# Altium footprint library User.PcbLib: 317 footprints (part 19 of 20)
Each footprint in its own frame and in the unit in brackets; x right, y up, seen from the top. Pads: shape width x height; smd on the part's side, far side on the other; paste and mask are expansions set on the pad; w line width, h text height; cw(c..) or ccw(c..) is an arc to the next point about the centre after c.
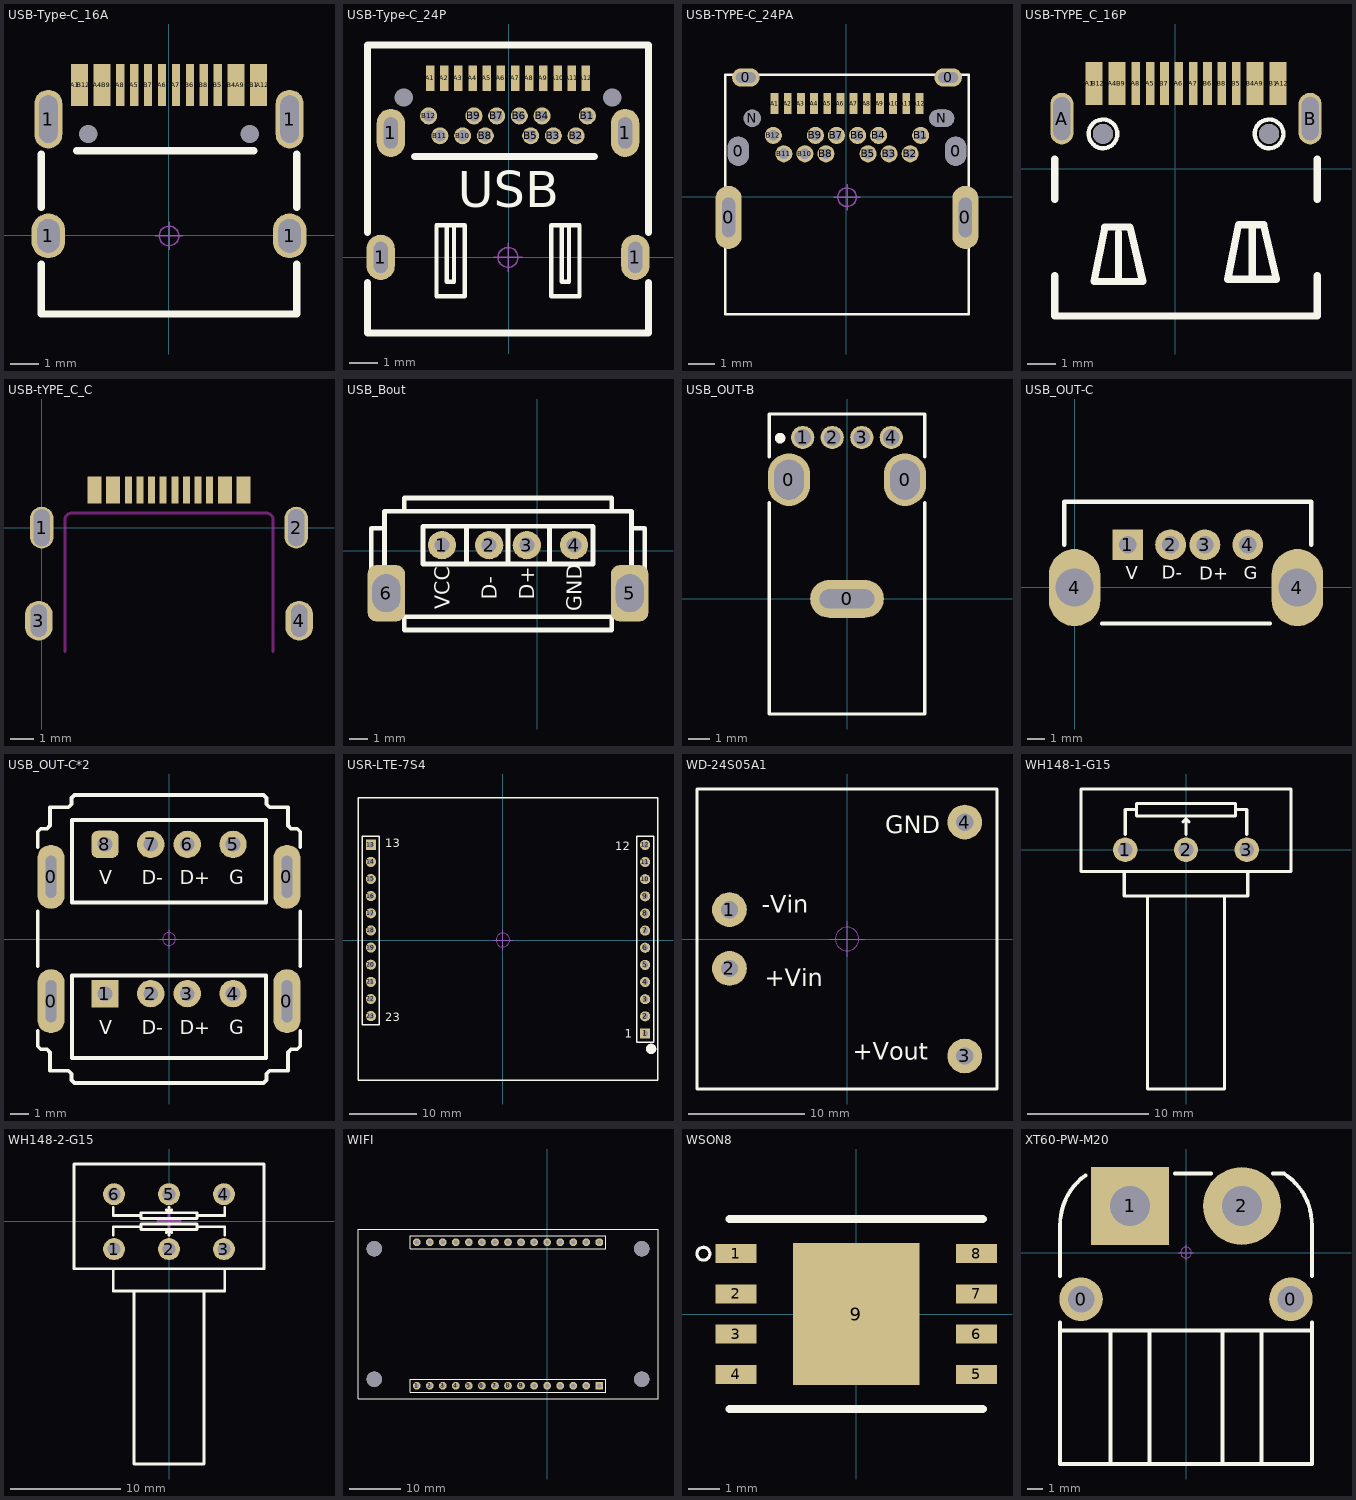
[diagram p18: the footprints below, top view; thin cyan lines are the x and y axes]

## USB-Type-C_16A [mm]
pads (22):
  round 0 hole 0.65: 0(-2.89,3.625) 0(2.89,3.625)
  oval 1.2x1.6 hole 0.8 slot 1.2 at 90 deg: 1(-4.32,-0.025) 1(4.32,-0.025)
  oval 1x2.1 hole 0.66 slot 1.7 at 90 deg: 1(-4.32,4.155) 1(4.32,4.155)
  rect 0.3x1.5 smd: A1(-3.35,5.375) A4(-2.55,5.375) A5(-1.25,5.375) A6(-0.25,5.375) A7(0.25,5.375) A8(-1.75,5.375) A9(2.55,5.375) A12(3.35,5.375) B1(3.05,5.375) B4(2.25,5.375) B5(1.75,5.375) B6(0.75,5.375) B7(-0.75,5.375) B8(1.25,5.375) B9(-2.25,5.375) B12(-3.05,5.375)
Top Overlay:
  lines w0.254: -4.572,-1.041 -4.572,-2.819 4.572,-2.819 4.572,-1.041 ; -4.572,0.991 -4.572,2.896 ; -3.302,3.023 3.048,3.023 ; 4.572,0.991 4.572,2.896
Mechanical 15:
  circle w0.05: c0,-0.025 r0.35
  lines w0.05: -0.5,-0.025 0.5,-0.025 ; 0,-0.525 0,0.475
3D body "USB Type-C_A.STEP": height 3.25, standoff -0.85, extent -4.47,-2.625 4.47,5.275

## USB-Type-C_24P [mm] "USB"
pads (30):
  round 0 hole 0.65: 0(-3.7,5.64) 0(3.65,5.64)
  oval 1x1.6 hole 0.5 slot 1.1 at 90 deg: 1(-4.515,0) 1(4.465,0)
  oval 1x1.7 hole 0.5 slot 1.1 at 90 deg: 1(-4.155,4.39) 1(4.105,4.39)
  rect 0.3x0.9 smd: A1(-2.775,6.315) A2(-2.275,6.315) A3(-1.775,6.315) A4(-1.275,6.315) A5(-0.775,6.315) A6(-0.275,6.315) A7(0.225,6.315) A8(0.725,6.315) A9(1.225,6.315) A10(1.725,6.315) A11(2.225,6.315) A12(2.725,6.315)
  round 0.6 hole 0.4: B1(2.775,4.99) B2(2.375,4.29) B3(1.575,4.29) B4(1.175,4.99) B5(0.775,4.29) B6(0.375,4.99) B7(-0.425,4.99) B8(-0.825,4.29) B9(-1.225,4.99) B10(-1.625,4.29) B11(-2.425,4.29) B12(-2.825,4.99)
Top Overlay:
  lines w0.152: -2.184,1.13 -2.184,-0.855 -1.981,-0.855 -1.93,-0.855 -1.93,1.13 ; 1.873,1.13 1.873,-0.855 2.127,-0.855 2.127,1.13 ; -2.545,-1.37 -1.545,-1.37 -1.545,1.13 -2.545,1.13 -2.545,-1.37 ; 1.499,-1.37 1.499,1.13 2.499,1.13 2.499,-1.37 1.499,-1.37
  lines w0.254: -4.978,-0.889 -4.978,-2.667 4.928,-2.667 4.928,-0.889 ; -4.978,0.889 -4.978,7.493 4.928,7.493 4.928,0.889 ; -3.327,3.556 3.023,3.556
  text "USB" at -1.803,1.778 h1.27
Mechanical 15:
  circle w0.05: c-0.025,0 r0.35
  lines w0.05: -0.525,0 0.475,0 ; -0.025,-0.5 -0.025,0.5
3D body "USB Type-C_24pin_A.STEP": height 3.31, standoff -1.33, extent -4.875,-2.53 4.825,7.37

## USB-TYPE-C_24PA [mm]
pads (32):
  oval 1x2.4 hole 0.5 slot 1.5 at 90 deg: 0(-4.475,-0.79) 0(4.525,-0.79)
  oval 0.8x1.1 hole 0.8 slot 1.1 at 90 deg: 0(-4.105,1.725) 0(4.155,1.725)
  oval 1.05x0.7 hole 0.4 slot 0.75 at 0 deg: 0(-3.82,4.525) 0(3.87,4.525)
  rect 0.3x0.8 smd: A1(-2.725,3.535) A2(-2.225,3.535) A3(-1.725,3.535) A4(-1.225,3.535) A5(-0.725,3.535) A6(-0.225,3.535) A7(0.275,3.535) A8(0.775,3.535) A9(1.275,3.535) A10(1.775,3.535) A11(2.275,3.535) A12(2.775,3.535)
  round 0.65 hole 0.4: B1(2.825,2.325) B2(2.425,1.625) B3(1.625,1.625) B4(1.225,2.325) B5(0.825,1.625) B6(0.425,2.325) B7(-0.375,2.325) B8(-0.775,1.625) B9(-1.175,2.325) B10(-1.575,1.625) B11(-2.375,1.625) B12(-2.775,2.325)
  round 0.65 hole 0.65: N(-3.575,2.975)
  oval 0.95x0.65 hole 0.65 slot 0.95 at 0 deg: N(3.625,2.975)
Top Overlay:
  lines w0.1: -4.6,-4.475 4.65,-4.475 4.65,4.625 -4.6,4.625 -4.6,-4.475
Mechanical 15:
  circle w0.05: c0.025,-0.025 r0.35
  lines w0.05: -0.475,-0.025 0.525,-0.025 ; 0.025,-0.525 0.025,0.475
3D body "type-Cĸ?": height 3.35, standoff -0.9, extent -4.6,-4.475 4.65,4.625

## USB-TYPE_C_16P [mm] "USB"
pads (20):
  oval 0.8x1.8 hole 0.6 slot 1.5 at 90 deg: A(-3.953,1.745) B(4.687,1.745)
  rect 0.3x1.5 smd: A1(-2.983,2.965) A4(-2.183,2.965) A5(-0.883,2.965) A6(0.117,2.965) A7(0.617,2.965) A8(-1.383,2.965) A9(2.917,2.965) A12(3.717,2.965) B1(3.417,2.965) B4(2.617,2.965) B5(2.117,2.965) B6(1.117,2.965) B7(-0.383,2.965) B8(1.617,2.965) B9(-1.883,2.965) B12(-2.683,2.965)
  round 0.7 hole 0.7 unplated: ""(-2.523,1.215) ""(3.257,1.215)
Top Overlay:
  circle w0.15: c3.257,1.215 r0.5
  circle w0.15: c-2.523,1.215 r0.5
  lines w0.254: -4.205,-3.726 -4.205,-5.123 4.939,-5.123 4.939,-3.726 ; -4.205,-1.059 -4.205,0.338 ; -1.981,-3.923 -1.981,-2.223 ; 2.669,-3.847 2.669,-1.947 ; 4.939,-1.059 4.939,0.338 ; -2.831,-3.923 -2.456,-2.023 -1.581,-2.023 -1.137,-3.923 -2.831,-3.923 ; 1.819,-3.847 3.513,-3.847 3.069,-1.947 2.194,-1.947 1.819,-3.847
3D body "USB Type-C_A.STEP": height 3.25, standoff -0.85, extent -4.113,-5.039 4.827,2.861

## USB-tYPE_C_C [mm]
pads (20):
  oval 1x1.8 hole 0.7 slot 1.6 at 90 deg: 1(0,0) 2(10.946,0)
  oval 1.2x1.7 hole 0.7 slot 1.4 at 90 deg: 3(-0.127,-4) 4(11.073,-4)
  rect 0.3x1.168 smd: A1(2.123,1.625) A4(2.923,1.625) A5(4.223,1.625) A6(5.223,1.625) A7(5.723,1.625) A8(3.723,1.625) A9(8.023,1.625) A12(8.823,1.625) B1(8.523,1.625) B4(7.723,1.625) B5(7.223,1.625) B6(6.223,1.625) B7(4.723,1.625) B8(6.723,1.625) B9(3.223,1.625) B12(2.423,1.625)
Keep-Out Layer:
  lines w0.127: 0.995,0.33 cw(c1.295,0.33) 1.295,0.63 ; 0.999,-5.334 0.999,0.333 ; 1.3,0.635 9.646,0.635 ; 9.651,0.63 cw(c9.651,0.33) 9.951,0.33 ; 9.948,-5.334 9.948,0.333
3D body "usbt_H0_48-L8_3.STEP": height 2.27, standoff -0.89, extent -0.275,-7.391 11.125,0.909

## USB_Bout [mm] "USB"
pads (6):
  round 1.5 hole 0.8: 1(-5.05,0.3) 2(-2.55,0.3) 3(-0.55,0.3) 4(1.95,0.3)
  rrect50% 2x3 hole 2 slot 1.5 at 0 deg: 5(4.9,-2.25) 6(-8,-2.25)
Top Overlay:
  lines w0.254: -8.1,-2.6 -8.8,-2.6 -8.8,1.2 -8.1,1.2 ; -7.05,-3.5 -7.05,-4.2 3.95,-4.2 3.95,-3.5 ; -7.05,2.1 -7.05,2.8 3.95,2.8 3.95,2.1 ; -3.75,-0.7 -3.75,1.3 ; -1.55,-0.7 -1.55,1.3 ; 0.65,-0.7 0.65,1.3 ; 5,-2.6 5.7,-2.6 5.7,1.2 5,1.2 ; -8.1,-3.5 5,-3.5 5,2.1 -8.1,2.1 -8.1,-3.5 ; -6.05,-0.7 -6.05,1.3 2.95,1.3 2.95,-0.7 -6.05,-0.7
  text "VCC" at -4.65,-3.1 h0.8
  text "D-" at -2.15,-2.6 h0.8
  text "D+" at -0.15,-2.6 h0.8
  text "GND" at 2.35,-3.2 h0.8
Bottom Overlay:
  lines w0.254: -3.75,-0.7 -3.75,1.3 ; -1.55,-0.7 -1.55,1.3 ; 0.65,-0.7 0.65,1.3 ; -8.15,-3.5 -8.15,2.1 5.05,2.1 5.05,-3.5 -8.15,-3.5 ; -6.05,-0.7 -6.05,1.3 2.95,1.3 2.95,-0.7 -6.05,-0.7
3D body "Samtec-USBR-A-S-S-O-TH.STEP": height 2.2, standoff -8.65, extent -9.352,-12.594 6.448,1.566

## USB_OUT-B [mm]
pads (7):
  oval 2x2.5 hole 1.4 slot 1.9 at 90 deg: 0(-2.75,5.65) 0(2.75,5.65)
  oval 3.5x1.8 hole 0.9 slot 2.6 at 0 deg: 0(0,0)
  round 1.1 hole 0.8: 1(-2.1,7.65) 2(-0.7,7.65) 3(0.7,7.65) 4(2.1,7.65)
Top Overlay:
  circle w0.25: c-3.173,7.62 r0.125
  lines w0.152: -3.683,4.572 -3.683,-5.461 3.683,-5.461 3.683,4.572 ; -3.683,6.731 -3.683,8.763 3.683,8.763 3.683,6.731
3D body "USB A型?": height 13.7, standoff -3.05, extent -3.56,-5.35 3.56,8.65

## USB_OUT-C [mm]
pads (6):
  rect 1.8x1.8 hole 1: 1(3.1,2.475)
  round 1.8 hole 1: 2(5.6,2.475) 3(7.6,2.475) 4(10.1,2.475)
  oval 3x4.5 hole 2.2: 4(0,-0.025) 4(13,-0.025)
Top Overlay:
  lines w0.254: -0.6,2.475 -0.6,4.975 13.8,4.975 13.8,2.475 ; 1.6,-2.125 11.4,-2.125
  text "V" at 2.988,0.468 h0.76
  text "G" at 9.871,0.468 h0.76
  text "D+" at 7.281,0.443 h0.76
  text "D-" at 5.096,0.493 h0.76
Mechanical 1:
  lines w0.254: 2.9,2.275 cw(c3.1,2.275) 3.1,2.475
3D body "USB-H.stp": height 14, standoff -4, extent -0.605,-2.124 13.795,4.976

## USB_OUT-C*2 [mm]
pads (12):
  oval 1.5x3.5 hole 0.6 slot 2.3 at 90 deg: 0(-6.45,-3.4) 0(-6.45,3.4) 0(6.45,-3.4) 0(6.45,3.4)
  rect 1.5x1.5 hole 0.8: 1(-3.5,-2.985)
  round 1.5 hole 0.8: 2(-1,-2.985) 3(1,-2.985) 4(3.5,-2.985) 5(3.5,5.17) 6(1,5.17) 7(-1,5.17)
  rrect50% 1.5x1.5 hole 0.8: 8(-3.5,5.17)
Top Overlay:
  lines w0.203: -7.176,-5.024 -7.176,-5.863 -7.007,-6.031 -6.67,-6.031 -6.501,-6.2 -6.5,-6.199 -6.5,-7.199 -5.5,-7.199 -5.331,-7.369 -5.331,-7.706 -5.162,-7.875 5.162,-7.875 5.331,-7.706 5.331,-7.369 5.5,-7.2 6.5,-7.199 6.5,-6.199 6.501,-6.2 6.67,-6.031 7.007,-6.031 7.176,-5.863 7.176,-5.024 ; -7.176,-1.476 -7.176,1.524 ; -7.176,5.024 -7.176,5.863 -7.007,6.031 -6.67,6.031 -6.501,6.2 -6.5,6.199 -6.5,7.199 -5.5,7.199 -5.331,7.369 -5.331,7.706 -5.162,7.875 5.163,7.875 5.331,7.706 5.331,7.369 5.5,7.2 6.5,7.199 6.5,6.199 6.501,6.2 6.67,6.031 7.007,6.031 7.176,5.863 7.176,5.024 ; 7.176,-1.476 7.176,1.524 ; -5.3,-6.5 5.3,-6.5 5.3,-2 -5.3,-2 -5.3,-6.5 ; -5.3,2 -5.3,6.5 5.3,6.5 5.3,2 -5.3,2
  text "V" at -3.812,-5.207 h0.76
  text "G" at 3.3,-5.2 h0.76
  text "D+" at 0.6,-5.2 h0.76
  text "D-" at -1.5,-5.2 h0.76
  text "D-" at -1.5,3 h0.76
  text "D+" at 0.6,3 h0.76
  text "G" at 3.3,3 h0.76
  text "V" at -3.812,2.993 h0.76
Mechanical 15:
  circle w0.05: c0,0 r0.35
  lines w0.05: -0.5,0 0.5,0 ; 0,-0.5 0,0.5
3D body "USB A型14-2-14_2-180.STEP": height 14.26, standoff -4.03, extent -7.927,-7.8 7.927,7.8

## USR-LTE-7S4 [mm] "全网通4G DTU透传模块"
pads (23):
  rect 1.5x1.5 hole 0.85: 1(21.082,-13.843) 13(-19.558,14.122)
  round 1.5 hole 0.85: 2(21.082,-11.303) 3(21.082,-8.763) 4(21.082,-6.223) 5(21.082,-3.683) 6(21.082,-1.143) 7(21.082,1.397) 8(21.082,3.937) 9(21.082,6.477) 10(21.082,9.017) 11(21.082,11.557) 12(21.082,14.097) 14(-19.558,11.582) 15(-19.558,9.042) 16(-19.558,6.502) 17(-19.558,3.962) 18(-19.558,1.422) 19(-19.558,-1.118) 20(-19.558,-3.658) 21(-19.558,-6.198) 22(-19.558,-8.738) 23(-19.558,-11.278)
Top Overlay:
  circle w0.762: c21.971,-16.129 r0.381
  lines w0.2: -20.828,-12.548 -20.828,13.487 -20.828,15.392 -18.288,15.392 -18.288,-12.548 -20.828,-12.548 ; 19.812,-15.113 22.352,-15.113 22.352,-13.208 22.352,15.367 19.812,15.367 19.812,-15.113
  lines w0.203: -21.463,-20.748 22.987,-20.748 22.987,21.052 -21.463,21.052 -21.463,-20.748
  text "23" at -17.399,-12.065 h1.27
  text "13" at -17.398,13.716 h1.27
  text "12" at 16.637,13.335 h1.27
  text "1" at 18.034,-14.478 h1.27
Mechanical 15:
  circle w0.1: c0,0 r1.016
  lines w0.1: -1.524,0 1.524,0 ; 0,-1.524 0,1.524

## WD-24S05A1 [mm] "3W-24V转5V模块"
pads (4):
  round 3 hole 1.5: 1(-10.15,2.538) 2(-10.15,-2.542) 3(10.17,-10.102) 4(10.17,10.098)
Top Overlay:
  lines w0.254: -12.954,-12.954 -12.954,12.954 12.954,12.954 12.954,-12.954 -12.954,-12.954
  text "+Vin" at -7.112,-4.064 h1.52
  text "-Vin" at -7.366,2.286 h1.52
  text "GND" at 3.302,9.144 h1.52
  text "+Vout" at 0.508,-10.414 h1.52
Mechanical 15:
  circle w0.1: c0,0 r1.016
  lines w0.1: -1.524,0 1.524,0 ; 0,-1.524 0,1.524
3D body "WD3-24S05A1.STEP": height 8.6, standoff -3.1, extent -12.75,-12.75 12.75,12.75

## WH148-1-G15 [mm] "单联电位器，脚距：5mm，柄长：15mm"
pads (3):
  round 2 hole 1.2: 1(-5,0) 2(0,0) 3(5,0)
Top Overlay:
  lines w0.254: -5.08,-1.778 -5.08,-3.8 5.08,-3.8 5.08,-1.778 ; -5,1.27 -5,3.302 -4.064,3.302 ; -3.175,-3.81 -3.175,-19.685 3.175,-19.685 3.175,-3.81 ; -0.254,2.286 0,2.54 ; 0,1.27 0,2.54 ; 0.254,2.286 0,2.54 ; 4.064,3.302 4.572,3.302 5,3.302 5,1.27 ; -8.636,-1.778 8.636,-1.778 8.636,5 -8.636,5 -8.636,-1.778 ; -4.064,2.794 4.064,2.794 4.064,3.81 -4.064,3.81 -4.064,2.794
3D body "WH148-1-G15.STEP": height 20.95, standoff -3.8, extent -8.45,-19.5 8.45,4.8

## WH148-2-G15 [mm] "双联电位器，脚距：5mm，柄长：15mm"
pads (6):
  round 2 hole 1.2: 1(-5,-2.54) 2(0,-2.54) 3(5,-2.54) 4(5,2.46) 5(0,2.46) 6(-5,2.46)
Top Overlay:
  lines w0.254: -5.08,-4.318 -5.08,-6.34 5.08,-6.34 5.08,-4.318 ; -5.08,-1.27 -5.08,-0.508 -2.54,-0.508 ; -5.08,1.27 -5.08,0.508 -2.54,0.508 ; -3.175,-6.35 -3.175,-22.098 3.175,-22.098 3.175,-6.35 ; -0.254,-1.016 0,-0.762 ; -0.254,1.016 0,0.762 ; 0,-1.27 0,-0.762 ; 0,1.27 0,0.762 ; 0.254,-1.016 0,-0.762 ; 0.254,1.016 0,0.762 ; 2.54,-0.508 5.08,-0.508 5.08,-1.27 ; 2.54,0.508 5.08,0.508 5.08,1.27 ; -2.54,-0.508 -2.54,-0.254 2.54,-0.254 2.54,-0.762 -2.54,-0.762 -2.54,-0.508 ; -2.54,0.508 -2.54,0.762 2.54,0.762 2.54,0.254 -2.54,0.254 -2.54,0.508 ; -8.636,-4.318 8.636,-4.318 8.636,5.207 -8.636,5.207 -8.636,-4.318
Mechanical 15:
  lines w0.254: -1.016,0 1.016,0 ; 0,-0.762 0,1.016
3D body "WH148-2-G15.STEP": height 20.95, standoff -3.8, extent -8.45,-22 8.45,5.009

## WIFI [mm]
pads (34):
  round 1.5 hole 0.9: 1(-25.4,350.52) 2(-22.86,350.52) 3(-20.32,350.52) 4(-17.78,350.52) 5(-15.24,350.52) 6(-12.7,350.52) 7(-10.16,350.52) 8(-7.62,350.52) 9(-5.08,350.52) 10(-2.54,350.52) 11(0,350.52) 12(2.54,350.52) 13(5.08,350.52) 14(7.62,350.52) 17(7.62,378.46) 18(5.08,378.46) 19(2.54,378.46) 20(0,378.46) 21(-2.54,378.46) 22(-5.08,378.46) 23(-7.62,378.46) 24(-10.16,378.46) 25(-12.7,378.46) 26(-15.24,378.46) 27(-17.78,378.46) 28(-20.32,378.46) 29(-22.86,378.46) 30(-25.4,378.46)
  rect 1.5x1.5 hole 0.9: 15(10.16,350.52)
  oct 1.5x1.5 hole 0.9: 16(10.16,378.46)
  round 3 hole 3.1: ""(-33.67,351.79) ""(-33.67,377.19) ""(18.43,351.79) ""(18.43,377.19)
Top Overlay:
  lines w0.02: -36.83,347.98 21.59,347.98 21.59,381 -36.83,381 -36.83,347.98
  lines w0.2: -26.67,349.25 11.43,349.25 11.43,351.79 -24.765,351.79 -26.67,351.79 -26.67,349.25 ; -26.67,377.19 -26.67,379.73 -24.765,379.73 11.43,379.73 11.43,377.19 -26.67,377.19
3D body: height 12, standoff 11, extent -38,347 23,382

## WSON8 [mm]
pads (9):
  rect 1.3x0.6 smd: 1(-3.8,1.905) 2(-3.8,0.635) 3(-3.8,-0.635) 4(-3.8,-1.905) 5(3.8,-1.905) 6(3.8,-0.635) 7(3.8,0.635) 8(3.8,1.905)
  rect 4x4.5 smd: 9(0,0)
Top Overlay:
  circle w0.1: c-4.826,1.905 r0.203
  lines w0.254: -4,-3 4,-3 ; -4,3 4,3
3D body "User Library-WSON-8_6x8mm.STEP": height 0.81, standoff -0.07, extent -4.039,-3 3.961,3

## XT60-PW-M20 [mm] "长：18.8mm， 宽：16mm，高：8.6mm"
pads (4):
  round 2.8 hole 1.7: 0(-6.75,-3) 0(6.75,-3)
  rect 5x5 hole 2.6: 1(-3.6,3)
  round 5 hole 2.6: 2(3.6,3)
Top Overlay:
  lines w0.254: -8.1,-4.5 -8.1,-5 ; -8.1,-1.5 -8.1,1.792 ; -8.1,1.738 cw(c-4.2,1.8) -6.476,4.967 ; -4.85,-13.6 -4.85,-5 ; -2.35,-13.6 -2.35,-5 ; -0.7,5.1 1.6,5.1 ; 2.35,-13.6 2.35,-5 ; 4.85,-13.6 4.85,-5 ; 5.6,5.1 6.294,5.1 ; 6.294,5.091 cw(c4.2,1.8) 8.1,1.738 8.1,-1.5 ; 8.1,-4.5 8.1,-5 ; -8.1,-5 8.1,-5 ; -8.1,-5 -8.1,-13.6 8.1,-13.6 8.1,-5
Mechanical 15:
  circle w0.05: c0,0 r0.35
  lines w0.05: -0.5,0 0.5,0 ; 0,-0.5 0,0.5
3D body "3D_xt60-PCB2_2021-12-22.step": height 9.7, standoff -1.4, extent -7.75,-14.97 7.75,5.029